# Altium footprint library Connectors.PcbLib: 42 footprints (part 2 of 3)
Each footprint in its own frame and in the unit in brackets; x right, y up, seen from the top. Pads: shape width x height; smd on the part's side, far side on the other; paste and mask are expansions set on the pad; w line width, h text height; cw(c..) or ccw(c..) is an arc to the next point about the centre after c.
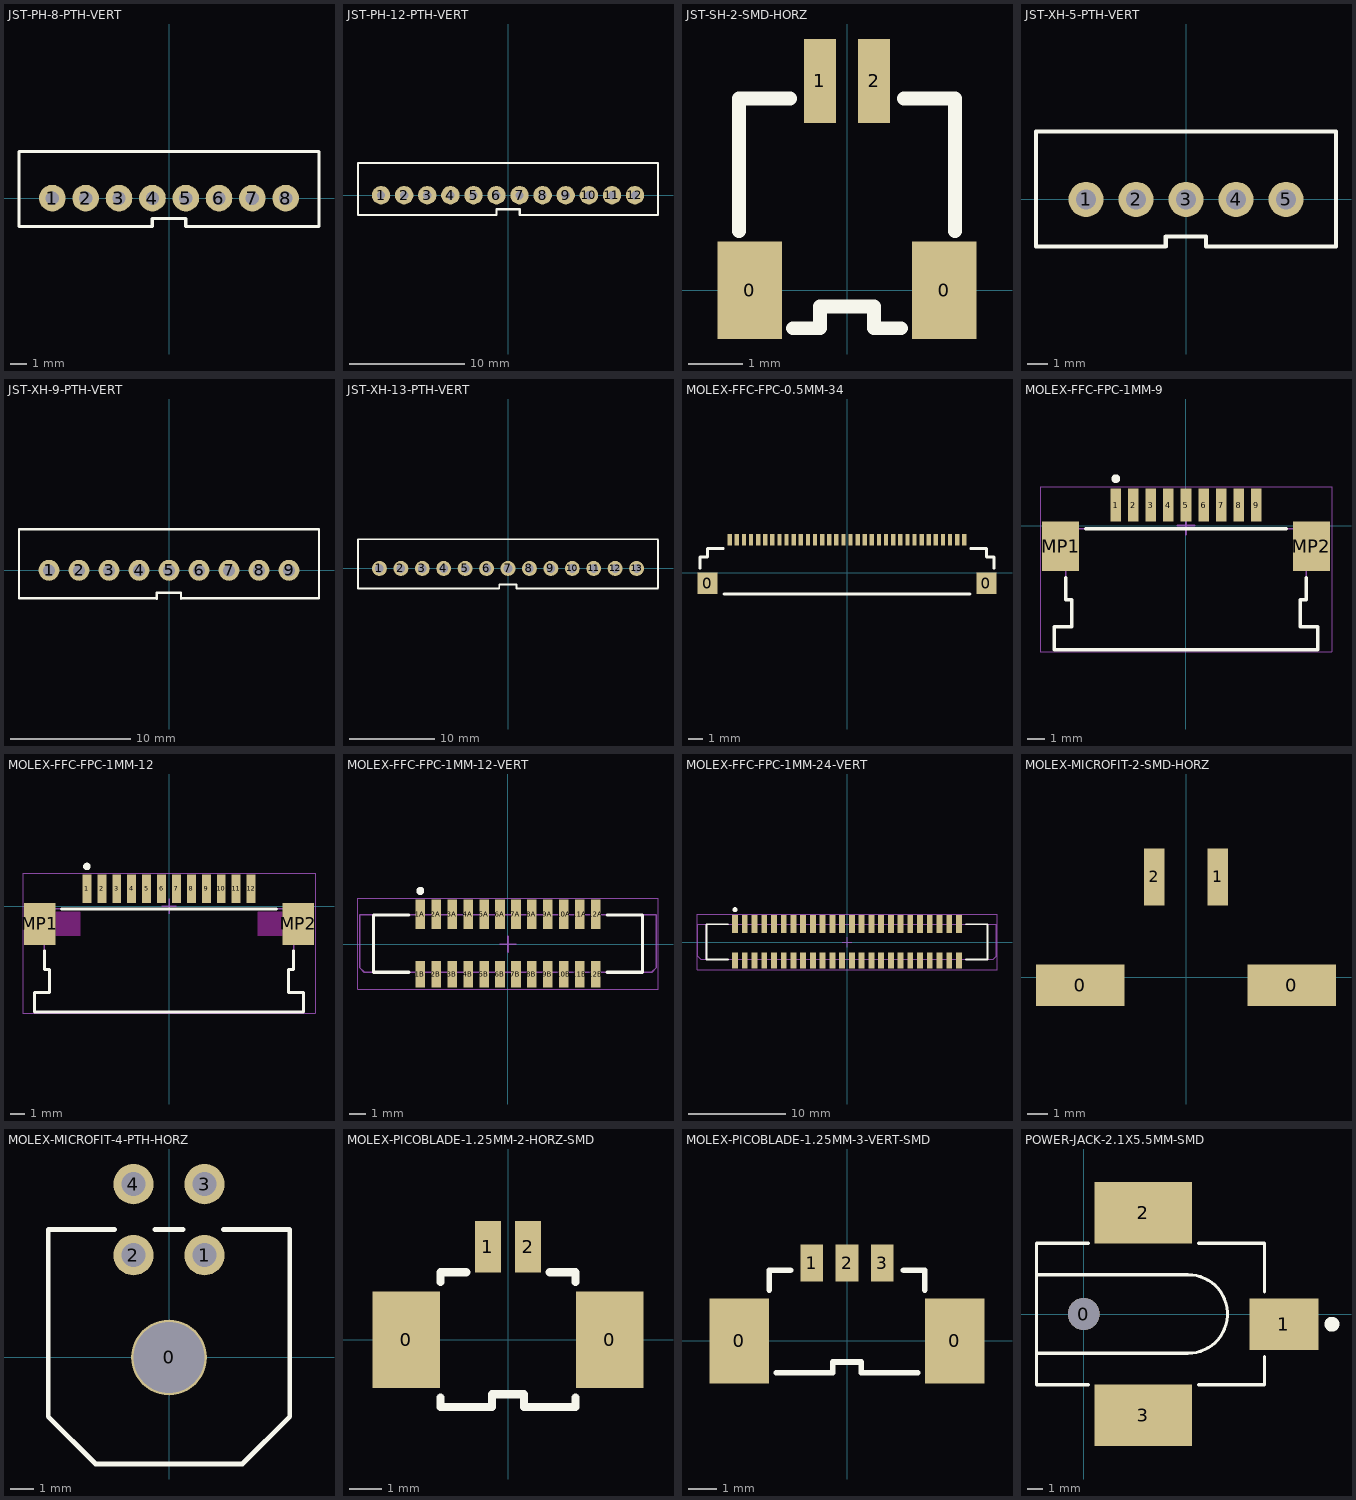
[diagram p1: the footprints below, top view; thin cyan lines are the x and y axes]

## JST-PH-8-PTH-VERT [mil]
pads (8):
  round 63 hole 31.5: 1(-275.59,0) 2(-196.85,0) 3(-118.11,0) 4(-39.11,0) 5(39.89,0) 6(118.11,0) 7(196.85,0) 8(275.59,0)
Top Overlay:
  lines w8: -354.33,-66.93 -354.33,110 354.33,110 354.33,-66.93 39.37,-66.93 39.37,-48.16 -39.37,-48.16 -39.37,-66.93 -354.33,-66.93
3D body "B8B-PH-K-S.STEP": height 236.22, standoff -133.86, extent -352.36,-67.16 352.36,110

## JST-PH-12-PTH-VERT [mil]
pads (12):
  round 63 hole 28: 1(-433.07,0) 2(-354.33,0) 3(-275.59,0) 4(-196.59,0) 5(-117.59,0) 6(-39.37,0) 7(39.37,0) 8(118.11,0) 9(196.85,0) 10(275.85,0) 11(354.85,0) 12(433.07,0)
Top Overlay:
  lines w8: -511.81,-67.84 -511.81,110 511.81,110 511.81,-67.84 40,-67.84 40,-48.16 -39.37,-48.16 -39.37,-67.84 -511.81,-67.84
3D body "B12B-PH-K-S.STEP": height 236.22, standoff -133.86, extent -511.81,-70.87 507.87,106.3

## JST-SH-2-SMD-HORZ [mm]
pads (4):
  rect 1.2x1.8 smd: 0(-1.8,0) 0(1.8,0)
  rect 0.6x1.55 smd: 1(-0.5,3.875) 2(0.5,3.875)
Top Overlay:
  lines w0.254: -2,1.1 -2,3.55 -1.05,3.55 ; -1,-0.7 -0.5,-0.7 -0.5,-0.3 0.5,-0.3 0.5,-0.7 1,-0.7 ; 1.05,3.55 2,3.55 2,1.1
3D body "SM02B-SRSS-TB.STEP": height 2.96, standoff 0, extent -2,-0.7 2,4.25

## JST-XH-5-PTH-VERT [mm]
pads (5):
  round 1.75 hole 1: 1(-5,0) 2(-2.5,0) 3(0,0) 4(2.5,0) 5(5,0)
Top Overlay:
  lines w0.203: -1.014,-2.358 -1.014,-1.858 1.002,-1.858 1.002,-2.358 ; -1.014,-2.35 -7.5,-2.35 -7.5,3.4 7.5,3.4 7.5,-2.3 ; 1.002,-2.35 7.5,-2.35
3D body "B5B-XH-A.STEP": height 7, standoff -3.4, extent -7.45,-2.375 7.45,3.375

## JST-XH-9-PTH-VERT [mm]
pads (9):
  round 1.75 hole 1: 1(-10,0) 2(-7.5,0) 3(-5,0) 4(-2.5,0) 5(0,0) 6(2.5,0) 7(5,0) 8(7.5,0) 9(10,0)
Top Overlay:
  lines w0.203: -1.014,-2.358 -1.014,-1.858 1.002,-1.858 1.002,-2.358 ; -1.014,-2.35 -12.5,-2.35 -12.5,3.4 12.5,3.4 12.5,-2.3 ; 1.002,-2.35 12.5,-2.35
3D body "B9B-XH-A.STEP": height 7.05, standoff -3.35, extent -12.45,-2.375 12.45,3.375

## JST-XH-13-PTH-VERT [mm]
pads (13):
  round 1.75 hole 1: 1(-15,0) 2(-12.5,0) 3(-10,0) 4(-7.5,0) 5(-5,0) 6(-2.5,0) 7(0,0) 8(2.5,0) 9(5,0) 10(7.5,0) 11(10,0) 12(12.5,0) 13(15,0)
Top Overlay:
  lines w0.203: -1.03,-2.35 -17.5,-2.35 -17.5,3.4 17.5,3.4 ; -1.014,-2.358 -1.014,-1.858 1.002,-1.858 1.002,-2.358 ; 1.002,-2.35 17.45,-2.35 17.5,-2.3 17.5,3.3
3D body "B13B-XH-A.STEP": height 7, standoff -3.4, extent -17.45,-2.375 17.45,3.375

## MOLEX-FFC-FPC-0.5MM-34 [mm]
pads (37):
  rect 1.4x1.5 smd: 0(-9.8,-0.75) 0(9.8,-0.75)
  rect 0.3x0.8 smd: 1(-8.25,2.3) 1(-8.25,2.3) 2(-7.75,2.3) 3(-7.25,2.3) 4(-6.75,2.3) 5(-6.25,2.3) 6(-5.75,2.3) 7(-5.25,2.3) 8(-4.75,2.3) 9(-4.25,2.3) 10(-3.75,2.3) 11(-3.25,2.3) 12(-2.75,2.3) 13(-2.25,2.3) 14(-1.75,2.3) 15(-1.25,2.3) 16(-0.75,2.3) 17(-0.25,2.3) 18(0.25,2.3) 19(0.75,2.3) 20(1.25,2.3) 21(1.75,2.3) 22(2.25,2.3) 23(2.75,2.3) 24(3.25,2.3) 25(3.75,2.3) 26(4.25,2.3) 27(4.75,2.3) 28(5.25,2.3) 29(5.75,2.3) 30(6.25,2.3) 31(6.75,2.3) 32(7.25,2.3) 33(7.75,2.3) 34(8.25,2.3)
Top Overlay:
  lines w0.2: -10.35,0.3 -10.35,1.1 -9.8,1.1 -9.8,1.7 -8.7,1.7 ; -8.65,-1.5 8.65,-1.5 ; 8.7,1.7 9.8,1.7 9.8,1.1 10.35,1.1 10.35,0.3
3D body "512963494.stp": height 1.25, standoff -0.05, extent -10.35,-1.799 10.35,2.5

## MOLEX-FFC-FPC-1MM-9 [mm] "FPC Connector, 9-Leads, Right Angle, Pitch 1.0 mm, Mated Height 2.7 mm, SMT"
height 2.712
pads (11):
  rect 0.6x1.9 smd: 1(-4,1.175) 2(-3,1.175) 3(-2,1.175) 4(-1,1.175) 5(0,1.175) 6(1,1.175) 7(2,1.175) 8(3,1.175) 9(4,1.175)
  rect 2.1x2.8 smd: MP1(-7.15,-1.175) MP2(7.15,-1.175)
Top Overlay:
  circle w0.25: c-4,2.675 r0.125
  lines w0.2: -6.85,-2.975 -6.85,-4.225 -6.513,-4.225 -6.512,-5.765 -7.5,-5.765 -7.5,-7.075 7.5,-7.075 7.5,-5.765 6.512,-5.765 6.512,-4.225 6.85,-4.225 6.85,-2.975 ; -5.7,-0.175 5.7,-0.175
Mechanical 13:
  lines w0.1: -7.5,-5.765 -6.512,-5.765 -6.512,-4.225 -6.85,-4.225 -6.85,-2.175 -7.65,-2.175 -7.65,-0.175 7.65,-0.175 7.65,-2.175 6.85,-2.175 6.85,-4.225 6.512,-4.225 6.512,-5.765 7.5,-5.765 7.5,-7.075 -7.5,-7.075 -7.5,-5.765
Mechanical 15:
  lines w0.05: -8.3,-7.175 8.3,-7.175 8.3,2.225 -8.3,2.225 -8.3,-7.175
  lines w0.1: -0.5,0 0.5,0 ; 0,-0.5 0,0.5
3D body "522070960.stp": height 2.71, standoff 0.01, extent -7.65,-7.075 7.65,1.825

## MOLEX-FFC-FPC-1MM-12 [mm] "FPC Connector, 12-Leads, Right Angle, Pitch 1.0 mm, Mated Height 2.7 mm, SMT"
height 2.712
pads (14):
  rect 0.6x1.9 smd: 1(-5.5,1.175) 2(-4.5,1.175) 3(-3.5,1.175) 4(-2.5,1.175) 5(-1.5,1.175) 6(-0.5,1.175) 7(0.5,1.175) 8(1.5,1.175) 9(2.5,1.175) 10(3.5,1.175) 11(4.5,1.175) 12(5.5,1.175)
  rect 2.1x2.8 smd: MP1(-8.65,-1.175) MP2(8.65,-1.175)
Top Overlay:
  circle w0.25: c-5.5,2.675 r0.125
  lines w0.2: -8.35,-2.975 -8.35,-4.225 -8.013,-4.225 -8.012,-5.765 -9,-5.765 -9,-7.075 9,-7.075 9,-5.765 8.012,-5.765 8.012,-4.225 8.35,-4.225 8.35,-2.975 ; -7.2,-0.175 7.2,-0.175
Keep-Out Layer:
  region: 7.6,-0.375 5.95,-0.375 5.95,-1.975 7.6,-1.975
  region: -7.6,-0.375 -5.95,-0.375 -5.95,-1.975 -7.6,-1.975
Mechanical 13:
  lines w0.1: -9.15,-2.175 -8.35,-2.175 -8.35,-4.225 -8.012,-4.225 -8.012,-5.765 -9,-5.765 -9,-7.075 9,-7.075 9,-5.765 8.012,-5.765 8.012,-4.225 8.35,-4.225 8.35,-2.175 9.15,-2.175 9.15,-0.175 -9.15,-0.175 -9.15,-2.175
Mechanical 15:
  lines w0.05: -9.8,-7.175 9.8,-7.175 9.8,2.225 -9.8,2.225 -9.8,-7.175
  lines w0.1: -0.5,0 0.5,0 ; 0,-0.5 0,0.5
3D body "522071260.stp": height 2.71, standoff 0.01, extent -9.15,-7.075 9.15,1.825

## MOLEX-FFC-FPC-1MM-12-VERT [mm] "FPC Connector, 12-Leads, Vertical, Pitch 1.0 mm, Mated Height 5.75 mm, SMT"
height 5.762
pads (24):
  rect 0.6x1.85 smd: 1A(-5.5,1.875) 2A(-4.5,1.875) 3A(-3.5,1.875) 4A(-2.5,1.875) 5A(-1.5,1.875) 6A(-0.5,1.875) 7A(0.5,1.875) 8A(1.5,1.875) 9A(2.5,1.875) 10A(3.5,1.875) 11A(4.5,1.875) 12A(5.5,1.875)
  rect 0.6x1.65 smd: 1B(-5.5,-1.875) 2B(-4.5,-1.875) 3B(-3.5,-1.875) 4B(-2.5,-1.875) 5B(-1.5,-1.875) 6B(-0.5,-1.875) 7B(0.5,-1.875) 8B(1.5,-1.875) 9B(2.5,-1.875) 10B(3.5,-1.875) 11B(4.5,-1.875) 12B(5.5,-1.875)
Top Overlay:
  circle w0.25: c-5.5,3.35 r0.125
  lines w0.2: -6.2,-1.75 -8.425,-1.75 -8.425,1.85 -6.2,1.85 ; 6.2,-1.75 8.425,-1.75 8.425,1.85 6.2,1.85
Mechanical 13:
  lines w0.1: -8.425,-1.75 -8.425,1.85 ; 8.425,-1.75 8.425,1.85 ; -9.3,-1.45 -9,-1.75 9,-1.75 9.3,-1.45 9.3,1.85 -9.3,1.85 -9.3,-1.45
Mechanical 15:
  lines w0.05: -9.4,-2.8 9.4,-2.8 9.4,2.9 -9.4,2.9 -9.4,-2.8
  lines w0.1: -0.5,0 0.5,0 ; 0,-0.5 0,0.5
3D body "526101272.stp": height 5.76, standoff 0.01, extent -9.3,-2.24 9.3,2.26

## MOLEX-FFC-FPC-1MM-24-VERT [mm] "FPC Connector, 24-Leads, Vertical, Pitch 1.0 mm, Mated Height 5.75 mm, SMT"
height 5.762
pads (48):
  rect 0.6x1.85 smd: 1A(-11.5,1.875) 2A(-10.5,1.875) 3A(-9.5,1.875) 4A(-8.5,1.875) 5A(-7.5,1.875) 6A(-6.5,1.875) 7A(-5.5,1.875) 8A(-4.5,1.875) 9A(-3.5,1.875) 10A(-2.5,1.875) 11A(-1.5,1.875) 12A(-0.5,1.875) 13A(0.5,1.875) 14A(1.5,1.875) 15A(2.5,1.875) 16A(3.5,1.875) 17A(4.5,1.875) 18A(5.5,1.875) 19A(6.5,1.875) 20A(7.5,1.875) 21A(8.5,1.875) 22A(9.5,1.875) 23A(10.5,1.875) 24A(11.5,1.875)
  rect 0.6x1.65 smd: 1B(-11.5,-1.875) 2B(-10.5,-1.875) 3B(-9.5,-1.875) 4B(-8.5,-1.875) 5B(-7.5,-1.875) 6B(-6.5,-1.875) 7B(-5.5,-1.875) 8B(-4.5,-1.875) 9B(-3.5,-1.875) 10B(-2.5,-1.875) 11B(-1.5,-1.875) 12B(-0.5,-1.875) 13B(0.5,-1.875) 14B(1.5,-1.875) 15B(2.5,-1.875) 16B(3.5,-1.875) 17B(4.5,-1.875) 18B(5.5,-1.875) 19B(6.5,-1.875) 20B(7.5,-1.875) 21B(8.5,-1.875) 22B(9.5,-1.875) 23B(10.5,-1.875) 24B(11.5,-1.875)
Top Overlay:
  circle w0.25: c-11.5,3.35 r0.125
  lines w0.2: -12.2,-1.75 -14.425,-1.75 -14.425,1.85 -12.2,1.85 ; 12.2,-1.75 14.425,-1.75 14.425,1.85 12.2,1.85
Mechanical 13:
  lines w0.1: -14.425,-1.75 -14.425,1.85 ; 14.425,-1.75 14.425,1.85 ; -15.3,-1.45 -15,-1.75 15,-1.75 15.3,-1.45 15.3,1.85 -15.3,1.85 -15.3,-1.45
Mechanical 15:
  lines w0.05: -15.4,-2.8 15.4,-2.8 15.4,2.9 -15.4,2.9 -15.4,-2.8
  lines w0.1: -0.5,0 0.5,0 ; 0,-0.5 0,0.5
3D body "526102472.stp": height 5.76, standoff 0.01, extent -15.3,-2.24 15.3,2.26

## MOLEX-MICROFIT-2-SMD-HORZ [mm] "Micro-Fit 3.0™ Right Angle Header, 3.00mm Pitch, Single Row, 2 Circuits, with Solder Tab, Tin, Glow Wire Capable, Black"
pads (4):
  rect 4.25x2 smd: 0(-5.08,-0.381) 0(5.08,-0.381)
  rect 1x2.75 smd: 1(1.524,4.826) 2(-1.524,4.826)
3D body "436500212.stp": height 5.64, standoff -0.04, extent -6.792,-4.989 6.858,5.751

## MOLEX-MICROFIT-4-PTH-HORZ [mm]
pads (5):
  round 3.2 hole 3: 0(0,0)
  round 1.7 hole 1.02: 1(1.5,4.32) 2(-1.5,4.32) 3(1.5,7.32) 4(-1.5,7.32)
Top Overlay:
  lines w0.203: -2.3,5.4 -5.1,5.4 -5.1,-2.5 -3.1,-4.5 3.1,-4.5 5.1,-2.5 5.1,5.4 2.3,5.4 ; -0.6,5.4 0.6,5.4
3D body "430450400.stp": height 8.83, standoff -3.12, extent -5.075,-4.55 5.075,7.69
3D body: height 0.25, standoff 0, extent -4.8,3 -4.8,3

## MOLEX-PICOBLADE-1.25MM-2-HORZ-SMD [mm]
pads (4):
  rect 2.1x3 smd: 0(-3.175,0) 0(3.175,0)
  rect 0.8x1.6 smd: 1(-0.625,2.9) 2(0.625,2.9)
Top Overlay:
  lines w0.254: -2.1,-1.8 -2.1,-2.1 -1,-2.1 -0.5,-2.1 -0.5,-1.7 0.5,-1.7 0.5,-2.1 1,-2.1 2.1,-2.1 2.1,-1.8 ; -2.1,1.8 -2.1,2.1 -1.3,2.1 ; 1.3,2.1 2.1,2.1 2.1,1.8
3D body "532610271.stp": height 3.4, standoff 0, extent -3.825,-2.075 3.825,3.125

## MOLEX-PICOBLADE-1.25MM-3-VERT-SMD [mm]
pads (5):
  rect 2.1x3 smd: 0(-3.8,0) 0(3.8,0)
  rect 0.8x1.3 smd: 1(-1.25,2.75) 2(0,2.75) 3(1.25,2.75)
Top Overlay:
  lines w0.2: -2.75,1.8 -2.75,2.5 ; 2.75,1.8 2.75,2.5
  lines w0.203: -2.75,2.5 -2,2.5 ; -2.5,-1.125 -0.5,-1.125 -0.5,-0.75 0.5,-0.75 0.5,-1.125 2.5,-1.125 ; 2,2.5 2.75,2.5
3D body "533980371.stp": height 4.77, standoff 0.03, extent -4.45,-1.1 4.45,3.1

## POWER-JACK-2.1X5.5MM-SMD [mm]
pads (4):
  round 2.032 hole 2.032: 0(0,0)
  rect 4.4x3.3 smd: 1(12.75,-0.65)
  rect 6.2x3.9 smd: 2(3.8,6.45) 3(3.8,-6.45)
Top Overlay:
  circle w0.5: c15.8,-0.65 r0.224
  lines w0.2: -3,-2.5 6.65,-2.5 ccw(c6.65,0) 6.65,2.5 -3,2.5 ; 0.3,-4.5 -3,-4.5 -3,4.5 0.3,4.5 ; 7.3,-4.5 11.5,-4.5 11.5,-2.7 ; 7.3,4.5 11.5,4.5 11.5,1.4
3D body "CUI_INC_PJ-036AH-SMT-TR.step": height 11, standoff -1.6, extent -3,-7.6 14.1,7.6